# Altium footprint library PcbLib1.PcbLib: 136 footprints (part 3 of 9)
Each footprint in its own frame and in the unit in brackets; x right, y up, seen from the top. Pads: shape width x height; smd on the part's side, far side on the other; paste and mask are expansions set on the pad; w line width, h text height; cw(c..) or ccw(c..) is an arc to the next point about the centre after c.
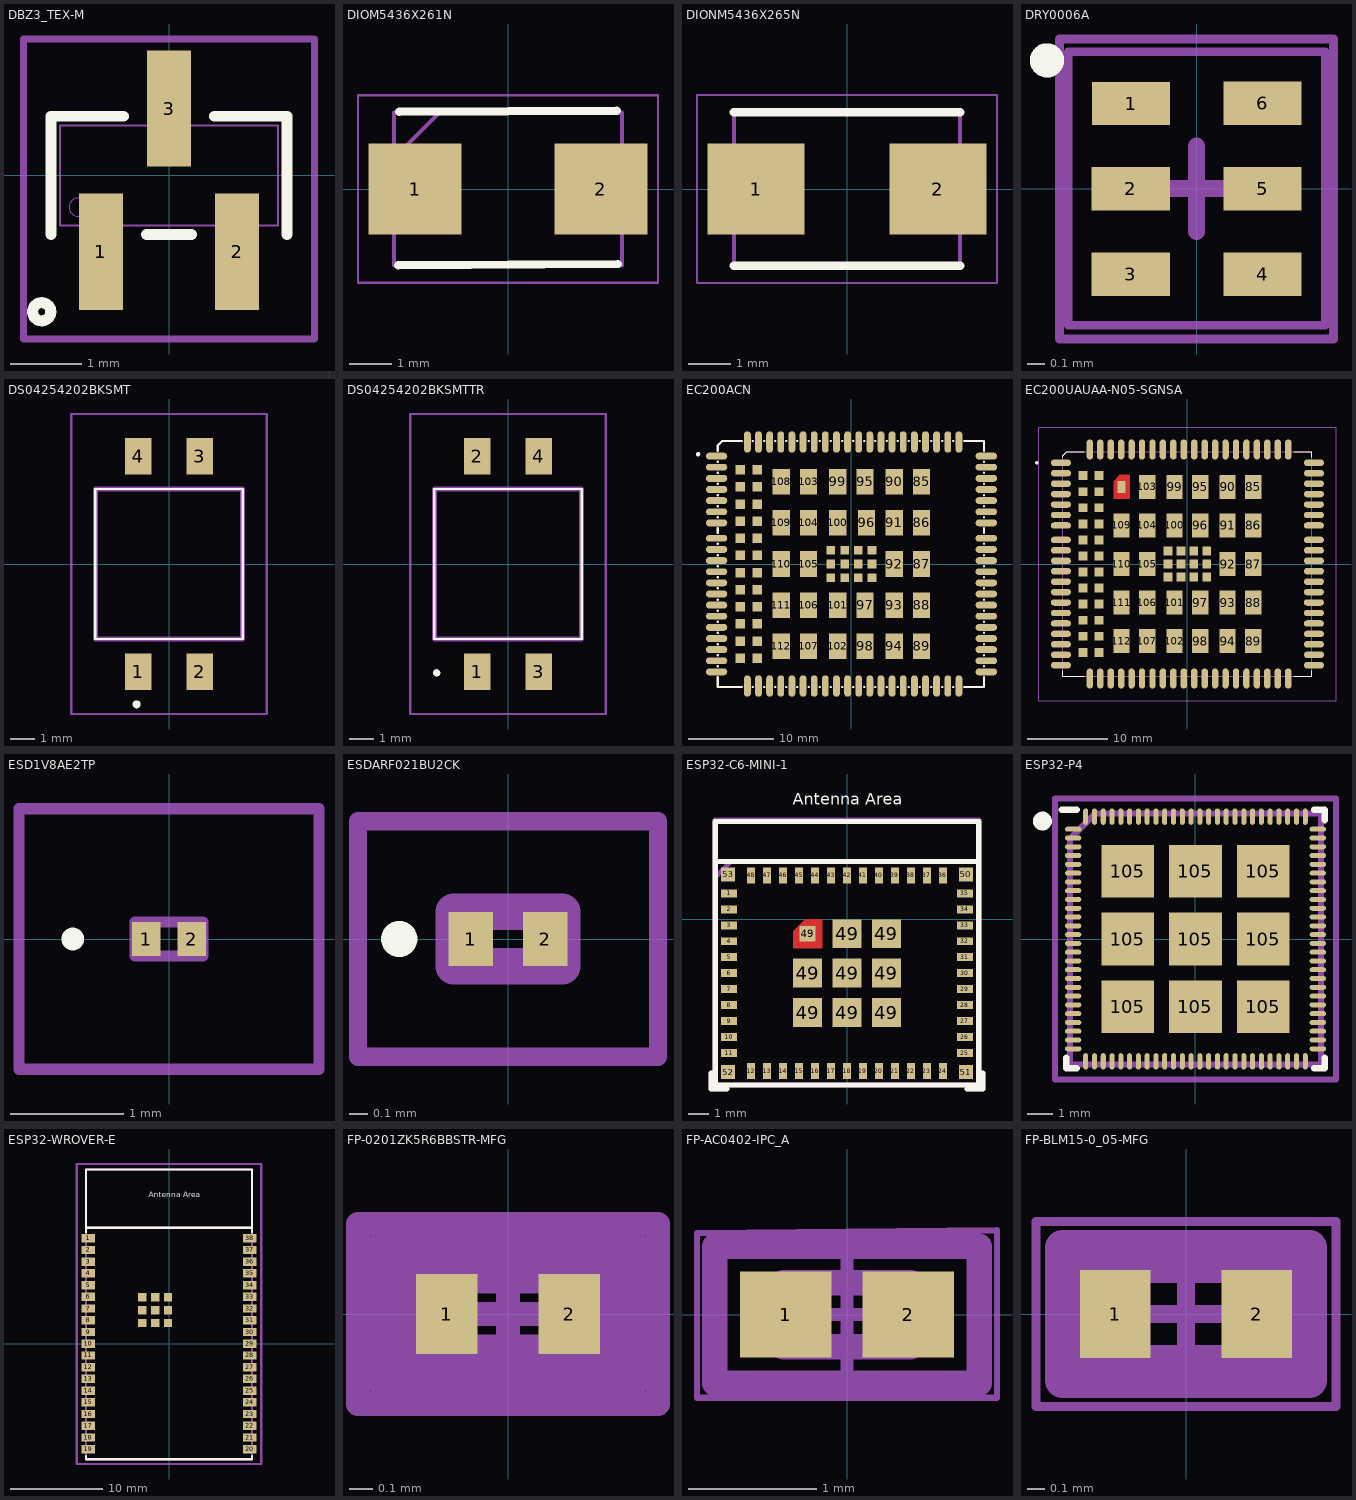
[diagram p2: the footprints below, top view; thin cyan lines are the x and y axes]

## DBZ3_TEX-M [mil]
pads (3):
  rect 24x64 smd paste+5.25 mask+5: 1(-37.4,-42) 2(37.4,-42) 3(0,36.75)
Top Overlay:
  circle w6: c-70,-75 r5
  lines w6: -65,-32.5 -65,32.5 -25.1,32.5 ; -12.3,-32.5 12.3,-32.5 ; 25.1,32.5 65,32.5 65,-32.5
Mechanical 13:
  circle w0: c-50,-17.5 r5
  lines w1: -60,-27.5 -60,27.5 60,27.5 60,-27.5 -60,-27.5 ; -47.4,-52 -27.4,-52 -27.4,-27.5 -47.4,-27.5 -47.4,-52 ; -10,27.5 -10,52 10,52 10,27.5 -10,27.5 ; 27.4,-52 47.4,-52 47.4,-27.5 27.4,-27.5 27.4,-52
Mechanical 15:
  lines w3.99: -80,-90 80,-90 80,75 -80,75 -80,-90
3D body "DBZ3_TEX.step": height 44.09, standoff 0, extent -60,-52.01 60,52.01

## DIOM5436X261N [mm]
pads (2):
  rect 2.2x2.15 smd: 1(-2.2,0) 2(2.2,0)
Top Overlay:
  lines w0.2: -2.6,-1.8 2.6,-1.775 ; -2.575,1.825 2.575,1.85
Top Courtyard:
  lines w0.05: -3.55,-2.22 3.55,-2.22 3.55,2.22 -3.55,2.22 -3.55,-2.22
Top 3D Body:
  lines w0.1: -2.7,0.735 -1.625,1.81 ; -2.7,-1.81 2.7,-1.81 2.7,1.81 -2.7,1.81 -2.7,-1.81
3D body "SMBJ14CA.stp": height 2.61, standoff 0, extent -2.7,-1.81 2.7,1.81

## DIONM5436X265N [mm]
pads (2):
  rect 2.3x2.15 smd: 1(-2.15,0) 2(2.15,0)
Top Overlay:
  lines w0.2: -2.675,-1.812 2.675,-1.812 ; -2.675,1.812 2.675,1.812
Mechanical 13:
  lines w0.1: -2.675,-1.812 2.675,-1.812 2.675,1.812 -2.675,1.812 -2.675,-1.812
Mechanical 15:
  lines w0.05: -3.55,-2.225 3.55,-2.225 3.55,2.225 -3.55,2.225 -3.55,-2.225
3D body "SMBJ14CA_R4G.stp": height 2.65, standoff 0, extent -2.675,-1.813 2.675,1.813

## DRY0006A [mil]
pads (6):
  rect 18x10 smd: 1(-15.09,19.6) 2(-15.16,0) 3(-15.16,-19.68) 4(15.16,-19.68) 5(15.16,0) 6(15.16,19.68)
Top Overlay:
  circle w3.94: c-34.45,29.53 r1.97
Top Courtyard:
  lines w1.97: -29.53,-31.5 29.61,-31.5 29.61,31.5 -29.53,31.5 -29.53,-31.5
  lines w3.94: -9.84,0 9.84,0 ; 0,-9.84 0,9.84
Mechanical 15:
  lines w1.98: -31.58,-34.61 -31.58,34.45 31.5,34.45 31.5,-34.61 -31.58,-34.61
3D body: height 23.62, standoff 0, extent -19.68,-28.54 19.68,28.54

## DS04254202BKSMT [mm]
pads (4):
  rect 1.1x1.5 smd: 1(-1.27,-4.45) 2(1.27,-4.45) 3(1.27,4.45) 4(-1.27,4.45)
Top Overlay:
  lines w0.1: -3.04,-3.1 -3.04,3.1 3.04,3.1 3.04,-3.1 -3.04,-3.1
  lines w0.2: -1.4,-5.8 ccw(c-1.335,-5.8) -1.27,-5.8 ; -1.4,-5.8 cw(c-1.335,-5.8) -1.27,-5.8 ; -1.4,-5.8 ccw(c-1.335,-5.8) -1.27,-5.8
Top Courtyard:
  lines w0.1: -4.04,-6.2 -4.04,6.2 4.04,6.2 4.04,-6.2 -4.04,-6.2
Top 3D Body:
  lines w0.2: -3.04,-3.1 -3.04,3.1 3.04,3.1 3.04,-3.1 -3.04,-3.1
3D body "DS04-254-2-02BK-SMT.stp": height 4, standoff 0, extent -3.043,-4.953 3.037,4.947

## DS04254202BKSMTTR [mm]
pads (4):
  rect 1.1x1.5 smd: 1(-1.27,-4.45) 2(-1.27,4.45) 3(1.27,-4.45) 4(1.27,4.45)
Top Overlay:
  lines w0.1: -3.04,-3.1 -3.04,3.1 3.04,3.1 3.04,-3.1 -3.04,-3.1
  lines w0.2: -3,-4.5 ccw(c-2.95,-4.5) -2.9,-4.5 ; -3,-4.5 cw(c-2.95,-4.5) -2.9,-4.5 ; -3,-4.5 ccw(c-2.95,-4.5) -2.9,-4.5
Top Courtyard:
  lines w0.1: -4.04,-6.2 -4.04,6.2 4.04,6.2 4.04,-6.2 -4.04,-6.2
Top 3D Body:
  lines w0.2: -3.04,-3.1 -3.04,3.1 3.04,3.1 3.04,-3.1 -3.04,-3.1
3D body "DS04-254-2-02BK-SMT-TR.stp": height 4, standoff 0, extent -3.043,-4.953 3.037,4.947

## EC200ACN [mm]
pads (144):
  oval 2.5x0.8 smd paste+0 mask+0: 1(-15.75,12.6) 2(-15.75,11.3) 3(-15.75,10) 4(-15.75,8.7) 5(-15.75,7.4) 6(-15.75,6.1) 7(-15.75,4.8) 8(-15.75,0.4) 9(-15.75,-0.9) 10(-15.75,-2.2) 11(-15.75,-3.5) 12(-15.75,-4.8) 13(-15.75,-6.1) 14(-15.75,-7.4) 15(-15.75,-8.7) 16(-15.75,-10) 17(-15.75,-11.3) 18(-15.75,-12.6) 37(15.75,-12.6) 38(15.75,-11.3) 39(15.75,-10) 40(15.75,-8.7) 41(15.75,-7.4) 42(15.75,-6.1) 43(15.75,-4.8) 44(15.75,-3.5) 45(15.75,-2.2) 46(15.75,-0.9) 47(15.75,0.4) 48(15.75,4.8) 49(15.75,6.1) 50(15.75,7.4) 51(15.75,8.7) 52(15.75,10) 53(15.75,11.3) 54(15.75,12.6) 141(-15.75,3) 142(-15.75,1.7) 143(15.75,1.7) 144(15.75,3)
  oval 0.8x2.5 smd paste+0 mask+0: 19(-9.55,-14.25) 20(-8.25,-14.25) 21(-6.95,-14.25) 22(-5.65,-14.25) 23(-4.35,-14.25) 24(-3.05,-14.25) 25(-1.75,-14.25) 26(-0.45,-14.25) 27(0.85,-14.25) 28(2.15,-14.25) 29(3.45,-14.25) 30(4.75,-14.25) 31(6.05,-14.25) 32(7.35,-14.25) 33(8.65,-14.25) 34(9.95,-14.25) 35(11.25,-14.25) 36(12.55,-14.25) 55(12.55,14.25) 56(11.25,14.25) 57(9.95,14.25) 58(8.65,14.25) 59(7.35,14.25) 60(6.05,14.25) 61(4.75,14.25) 62(3.45,14.25) 63(2.15,14.25) 64(0.85,14.25) 65(-0.45,14.25) 66(-1.75,14.25) 67(-3.05,14.25) 68(-4.35,14.25) 69(-5.65,14.25) 70(-6.95,14.25) 71(-8.25,14.25) 72(-9.55,14.25) 113(-10.85,14.25) 114(-12.15,14.25) 115(-10.85,-14.25) 116(-12.15,-14.25)
  rect 1x1 smd paste+0 mask+0: 73(2.4,1.6) 74(2.4,0) 75(2.4,-1.6) 76(0.8,1.6) 77(0.8,0) 78(0.8,-1.6) 79(-0.8,1.6) 80(-0.8,0) 81(-0.8,-1.6) 82(-2.4,1.6) 83(-2.4,0) 84(-2.4,-1.6)
  rect 2x3 smd paste+0 mask+0: 85(8.2,9.6) 86(8.2,4.8) 87(8.2,0) 88(8.2,-4.8) 89(8.2,-9.6) 90(5,9.6) 91(5,4.8) 92(5,0) 93(5,-4.8) 94(5,-9.6) 95(1.6,9.6) 96(1.778,4.8) 97(1.6,-4.8) 98(1.6,-9.6) 99(-1.6,9.6) 100(-1.6,4.8) 101(-1.6,-4.8) 102(-1.6,-9.6) 103(-5,9.6) 104(-5,4.8) 105(-5,0) 106(-5,-4.8) 107(-5,-9.6) 108(-8.2,9.6) 109(-8.2,4.8) 110(-8.2,0) 111(-8.2,-4.8) 112(-8.2,-9.6)
  rect 1.1x1.1 smd paste+0 mask+0: 117(-11,11) 118(-11,9) 119(-11,7) 120(-11,5) 121(-11,3) 122(-11,1) 123(-11,-1) 124(-11,-3) 125(-11,-5) 126(-11,-7) 127(-11,-9) 128(-11,-11) 129(-13,11) 130(-13,9) 131(-13,7) 132(-13,5) 133(-13,3) 134(-13,1) 135(-13,-1) 136(-13,-3) 137(-13,-5) 138(-13,-7) 139(-13,-9) 140(-13,-11)
Top Overlay:
  circle w0.254: c-17.907,12.827 r0.127
  lines w0.254: -15.621,-13.231 -15.621,-14.351 -12.781,-14.351 ; -15.621,-11.969 -15.621,-11.931 ; -15.621,-10.669 -15.621,-10.631 ; -15.621,-9.369 -15.621,-9.331 ; -15.621,-8.069 -15.621,-8.031 ; -15.621,-6.769 -15.621,-6.731 ; -15.621,-5.469 -15.621,-5.431 ; -15.621,-4.169 -15.621,-4.131 ; -15.621,-2.869 -15.621,-2.831 ; -15.621,-1.569 -15.621,-1.531 ; -15.621,-0.269 -15.621,-0.231 ; -15.621,1.031 -15.621,1.069 ; -15.621,2.331 -15.621,2.369 ; -15.621,3.631 -15.621,4.169 ; -15.621,5.431 -15.621,5.469 ; -15.621,6.731 -15.621,6.769 ; -15.621,8.031 -15.621,8.069 ; -15.621,9.331 -15.621,9.369 ; -15.621,10.631 -15.621,10.669 ; -15.621,11.931 -15.621,11.969 ; -15.621,13.231 -15.621,13.843 -15.113,14.351 -14.224,14.351 -12.781,14.351 ; -11.519,-14.351 -11.481,-14.351 ; -11.519,14.351 -11.481,14.351 ; -10.219,-14.351 -10.181,-14.351 ; -10.219,14.351 -10.181,14.351 ; -8.919,-14.351 -8.881,-14.351 ; -8.919,14.351 -8.881,14.351 ; -7.619,-14.351 -7.581,-14.351 ; -7.619,14.351 -7.581,14.351 ; -6.319,-14.351 -6.281,-14.351 ; -6.319,14.351 -6.281,14.351 ; -5.019,-14.351 -4.981,-14.351 ; -5.019,14.351 -4.981,14.351 ; -3.719,-14.351 -3.681,-14.351 ; -3.719,14.351 -3.681,14.351 ; -2.419,-14.351 -2.381,-14.351 ; -2.419,14.351 -2.381,14.351 ; -1.119,-14.351 -1.081,-14.351 ; -1.119,14.351 -1.081,14.351 ; 0.181,-14.351 0.219,-14.351 ; 0.181,14.351 0.219,14.351 ; 1.481,-14.351 1.519,-14.351 ; 1.481,14.351 1.519,14.351 ; 2.781,-14.351 2.819,-14.351 ; 2.781,14.351 2.819,14.351 ; 4.081,-14.351 4.119,-14.351 ; 4.081,14.351 4.119,14.351 ; 5.381,-14.351 5.419,-14.351 ; 5.381,14.351 5.419,14.351 ; 6.681,-14.351 6.719,-14.351 ; 6.681,14.351 6.719,14.351 ; 7.981,-14.351 8.019,-14.351 ; 7.981,14.351 8.019,14.351 ; 9.281,-14.351 9.319,-14.351 ; 9.281,14.351 9.319,14.351 ; 10.581,-14.351 10.619,-14.351 ; 10.581,14.351 10.619,14.351 ; 11.881,-14.351 11.919,-14.351 ; 11.881,14.351 11.919,14.351 ; 13.181,-14.351 15.494,-14.351 15.494,-13.231 ; 13.181,14.351 15.494,14.351 15.494,13.231 ; 15.494,-11.969 15.494,-11.931 ; 15.494,-10.669 15.494,-10.631 ; 15.494,-9.369 15.494,-9.331 ; 15.494,-8.069 15.494,-8.031 ; 15.494,-6.769 15.494,-6.731 ; 15.494,-5.469 15.494,-5.431 ; 15.494,-4.169 15.494,-4.131 ; 15.494,-2.869 15.494,-2.831 ; 15.494,-1.569 15.494,-1.531 ; 15.494,-0.269 15.494,-0.231 ; 15.494,1.031 15.494,1.069 ; 15.494,2.331 15.494,2.369 ; 15.494,3.631 15.494,4.169 ; 15.494,5.431 15.494,5.469 ; 15.494,6.731 15.494,6.769 ; 15.494,8.031 15.494,8.069 ; 15.494,9.331 15.494,9.369 ; 15.494,10.631 15.494,10.669 ; 15.494,11.931 15.494,11.969
3D body "EC200AEUHA-N06-MN0AA--3DModel-STEP-56544.STEP": height 2.6, standoff 0, extent -16,-14.5 16,14.5

## EC200UAUAA-N05-SGNSA [mm]
height 2.6
pads (144):
  oval 2.5x0.8 smd paste-2: 1(-15.75,12.6) 2(-15.75,11.3) 3(-15.75,10) 4(-15.75,8.7) 5(-15.75,7.4) 6(-15.75,6.1) 7(-15.75,4.8) 8(-15.75,0.4) 9(-15.75,-0.9) 10(-15.75,-2.2) 11(-15.75,-3.5) 12(-15.75,-4.8) 13(-15.75,-6.1) 14(-15.75,-7.4) 15(-15.75,-8.7) 16(-15.75,-10) 17(-15.75,-11.3) 18(-15.75,-12.6) 37(15.75,-12.6) 38(15.75,-11.3) 39(15.75,-10) 40(15.75,-8.7) 41(15.75,-7.4) 42(15.75,-6.1) 43(15.75,-4.8) 44(15.75,-3.5) 45(15.75,-2.2) 46(15.75,-0.9) 47(15.75,0.4) 48(15.75,4.8) 49(15.75,6.1) 50(15.75,7.4) 51(15.75,8.7) 52(15.75,10) 53(15.75,11.3) 54(15.75,12.6) 141(-15.75,3) 142(-15.75,1.7) 143(15.75,1.7) 144(15.75,3)
  oval 0.8x2.5 smd paste-2: 19(-9.55,-14.25) 20(-8.25,-14.25) 21(-6.95,-14.25) 22(-5.65,-14.25) 23(-4.35,-14.25) 24(-3.05,-14.25) 25(-1.75,-14.25) 26(-0.45,-14.25) 27(0.85,-14.25) 28(2.15,-14.25) 29(3.45,-14.25) 30(4.75,-14.25) 31(6.05,-14.25) 32(7.35,-14.25) 33(8.65,-14.25) 34(9.95,-14.25) 35(11.25,-14.25) 36(12.55,-14.25) 55(12.55,14.25) 56(11.25,14.25) 57(9.95,14.25) 58(8.65,14.25) 59(7.35,14.25) 60(6.05,14.25) 61(4.75,14.25) 62(3.45,14.25) 63(2.15,14.25) 64(0.85,14.25) 65(-0.45,14.25) 66(-1.75,14.25) 67(-3.05,14.25) 68(-4.35,14.25) 69(-5.65,14.25) 70(-6.95,14.25) 71(-8.25,14.25) 72(-9.55,14.25) 113(-10.85,14.25) 114(-12.15,14.25) 115(-10.85,-14.25) 116(-12.15,-14.25)
  rect 1.1x1.1 smd paste-2: 73(2.4,1.6) 74(2.4,0) 75(2.4,-1.6) 76(0.8,1.6) 77(0.8,0) 78(0.8,-1.6) 79(-0.8,1.6) 80(-0.8,0) 81(-0.8,-1.6) 82(-2.4,1.6) 83(-2.4,0) 84(-2.4,-1.6) 117(-11,11) 118(-11,9) 119(-11,7) 120(-11,5) 121(-11,3) 122(-11,1) 123(-11,-1) 124(-11,-3) 125(-11,-5) 126(-11,-7) 127(-11,-9) 128(-11,-11) 129(-13,11) 130(-13,9) 131(-13,7) 132(-13,5) 133(-13,3) 134(-13,1) 135(-13,-1) 136(-13,-3) 137(-13,-5) 138(-13,-7) 139(-13,-9) 140(-13,-11)
  rect 2x3 smd paste-3: 85(8.2,9.6) 86(8.2,4.8) 87(8.2,0) 88(8.2,-4.8) 89(8.2,-9.6) 90(5,9.6) 91(5,4.8) 92(5,0) 93(5,-4.8) 94(5,-9.6) 95(1.6,9.6) 96(1.6,4.8) 97(1.6,-4.8) 98(1.6,-9.6) 99(-1.6,9.6) 100(-1.6,4.8) 101(-1.6,-4.8) 102(-1.6,-9.6) 103(-5,9.6) 104(-5,4.8) 105(-5,0) 106(-5,-4.8) 107(-5,-9.6) 109(-8.2,4.8) 110(-8.2,0) 111(-8.2,-4.8) 112(-8.2,-9.6)
  rect 1x1.5 smd paste-2 mask+0: 108(-8.2,9.6)
Top Layer:
  region: -7.2,8.1 -9.2,8.1 -9.2,10.3 -8.4,11.1 -7.2,11.1
Top Overlay:
  circle w0.2: c-18.75,12.6 r0.1
  lines w0.127: -15.5,-13.32 -15.5,-14 -12.87,-14 ; -15.5,13.32 -15.5,13.5 -15,14 -12.87,14 ; 13.27,-14 15.5,-14 15.5,-13.32 ; 13.27,14 15.5,14 15.5,13.32
Top Paste:
  drawing of 216 lines, arcs and shapes, not listed
Top Solder:
  region: -7.1,8 -9.3,8 -9.3,10.341 -8.441,11.2 -7.1,11.2
Mechanical 13:
  circle w0.2: c-18.75,12.6 r0.1
  lines w0.127: -15.5,-14 -15.5,13.5 -15,14 15.5,14 15.5,-14 -15.5,-14
Mechanical 15:
  lines w0.05: -18.5,-17 18.5,-17 18.5,17 -18.5,17 -18.5,-17
3D body "step_temp.STEP": height 1.55, standoff -0.8, extent -15.5,-14 15.5,14

## ESD1V8AE2TP [mm]
pads (2):
  rect 0.25x0.3 smd: 1(-0.2,0) 2(0.2,0)
Top Overlay:
  lines w0.1: -0.9,0 ccw(c-0.85,0) -0.8,0 ccw(c-0.85,0) -0.9,0
Mechanical 13:
  lines w0.1: -0.3,-0.15 0.3,-0.15 0.3,0.15 -0.3,0.15 -0.3,-0.15
Mechanical 15:
  lines w0.1: -1.325,-1.15 1.325,-1.15 1.325,1.15 -1.325,1.15 -1.325,-1.15
3D body "ESD1V8AE2-TP.stp": height 0.31, standoff 0, extent -0.303,-0.15 0.297,0.15

## ESDARF021BU2CK [mm]
pads (2):
  rect 0.244x0.3 smd: 1(-0.206,0) 2(0.206,0)
Top Overlay:
  lines w0.1: -0.6,-0.05 cw(c-0.6,0) -0.6,0.05 cw(c-0.6,0) -0.6,-0.05
Mechanical 13:
  lines w0.2: -0.3,-0.15 0.3,-0.15 0.3,0.15 -0.3,0.15 -0.3,-0.15
Mechanical 15:
  lines w0.1: -0.828,-0.65 0.828,-0.65 0.828,0.65 -0.828,0.65 -0.828,-0.65
3D body "ESDARF02-1BU2CK.stp": height 0.43, standoff 0, extent -0.304,-0.15 0.304,0.15

## ESP32-C6-MINI-1 [mm]
pads (61):
  rect 0.8x0.4 smd: 1(-5.9,1.3) 2(-5.9,0.5) 3(-5.9,-0.3) 4(-5.9,-1.1) 5(-5.9,-1.9) 6(-5.9,-2.7) 7(-5.9,-3.5) 8(-5.9,-4.3) 9(-5.9,-5.1) 10(-5.9,-5.9) 11(-5.9,-6.7) 25(5.9,-6.7) 26(5.9,-5.9) 27(5.9,-5.1) 28(5.9,-4.3) 29(5.9,-3.5) 30(5.9,-2.7) 31(5.9,-1.9) 32(5.9,-1.1) 33(5.9,-0.3) 34(5.9,0.5) 35(5.9,1.3)
  rect 0.4x0.8 smd: 12(-4.8,-7.6) 13(-4,-7.6) 14(-3.2,-7.6) 15(-2.4,-7.6) 16(-1.6,-7.6) 17(-0.8,-7.6) 18(0,-7.6) 19(0.8,-7.6) 20(1.6,-7.6) 21(2.4,-7.6) 22(3.2,-7.6) 23(4,-7.6) 24(4.8,-7.6) 36(4.8,2.2) 37(4,2.2) 38(3.2,2.2) 39(2.4,2.2) 40(1.6,2.2) 41(0.8,2.2) 42(0,2.2) 43(-0.8,2.2) 44(-1.6,2.2) 45(-2.4,2.2) 46(-3.2,2.2) 47(-4,2.2) 48(-4.8,2.2)
  rect 1.45x1.45 smd: 49(-1.975,-4.675) 49(-1.975,-2.7) 49(0,-4.675) 49(0,-2.7) 49(0,-0.725) 49(1.975,-4.675) 49(1.975,-2.7) 49(1.975,-0.725)
  rect 0.8x0.8 smd: 49(-1.975,-0.725)
  rect 0.7x0.7 smd: 50(5.95,2.25) 51(5.95,-7.65) 52(-5.95,-7.65) 53(-5.95,2.25)
Top Layer:
  region: -1.25,-1.45 -2.7,-1.45 -2.7,-0.6 -2.1,0 -1.25,0
Top Overlay:
  lines w0.254: -6.8,-7.7 -6.8,-8.5 -6,-8.5 ; -6.6,2.9 6.6,2.9 ; 6,-8.5 6.8,-8.5 6.8,-7.7 ; -6.6,-8.3 -6.6,4.9 6.6,4.9 6.6,-8.3 -6.6,-8.3
  text "Antenna Area" at -2.716,5.525 h1
Top Paste:
  region: -1.25,-1.45 -2.7,-1.45 -2.7,-0.6 -2.1,0 -1.25,0
Top Solder:
  region: -1.25,-1.45 -2.7,-1.45 -2.7,-0.6 -2.1,0 -1.25,0
Top 3D Body:
  lines w0.254: -6.8,-7.7 -6.8,-8.5 -6,-8.5 ; -6.6,2.9 6.6,2.9 ; 6,-8.5 6.8,-8.5 6.8,-7.7 ; -6.6,-8.3 -6.6,4.9 6.6,4.9 6.6,-8.3 -6.6,-8.3
  text "Antenna Area" at -2.716,5.525 h1
Mechanical 6:
  lines w0.254: -6.6,2.1 -5.8,2.9 ; -6.6,2.9 6.6,2.9 ; -6.6,-8.3 -6.6,4.975 6.6,4.975 6.6,-8.3 -6.6,-8.3
  text "'.Designator'" at -2.417,-3.114 h1
3D body "ESP32-C6-MINI-1-N4.STEP": height 2.55, standoff 0, extent -6.6,-8.218 6.6,8.382

## ESP32-P4 [mm]
pads (113):
  rrect100% 0.65x0.2 smd: 1(-4.875,4.375) 2(-4.875,4.025) 3(-4.875,3.675) 4(-4.875,3.325) 5(-4.875,2.975) 6(-4.875,2.625) 7(-4.875,2.275) 8(-4.875,1.925) 9(-4.875,1.575) 10(-4.875,1.225) 11(-4.875,0.875) 12(-4.875,0.525) 13(-4.875,0.175) 14(-4.875,-0.175) 15(-4.875,-0.525) 16(-4.875,-0.875) 17(-4.875,-1.225) 18(-4.875,-1.575) 19(-4.875,-1.925) 20(-4.875,-2.275) 21(-4.875,-2.625) 22(-4.875,-2.975) 23(-4.875,-3.325) 24(-4.875,-3.675) 25(-4.875,-4.025) 26(-4.875,-4.375) 53(4.875,-4.375) 54(4.875,-4.025) 55(4.875,-3.675) 56(4.875,-3.325) 57(4.875,-2.975) 58(4.875,-2.625) 59(4.875,-2.275) 60(4.875,-1.925) 61(4.875,-1.575) 62(4.875,-1.225) 63(4.875,-0.875) 64(4.875,-0.525) 65(4.875,-0.175) 66(4.875,0.175) 67(4.875,0.525) 68(4.875,0.875) 69(4.875,1.225) 70(4.875,1.575) 71(4.875,1.925) 72(4.875,2.275) 73(4.875,2.625) 74(4.875,2.975) 75(4.875,3.325) 76(4.875,3.675) 77(4.875,4.025) 78(4.875,4.375)
  rrect100% 0.2x0.65 smd: 27(-4.375,-4.875) 28(-4.025,-4.875) 29(-3.675,-4.875) 30(-3.325,-4.875) 31(-2.975,-4.875) 32(-2.625,-4.875) 33(-2.275,-4.875) 34(-1.925,-4.875) 35(-1.575,-4.875) 36(-1.225,-4.875) 37(-0.875,-4.875) 38(-0.525,-4.875) 39(-0.175,-4.875) 40(0.175,-4.875) 41(0.525,-4.875) 42(0.875,-4.875) 43(1.225,-4.875) 44(1.575,-4.875) 45(1.925,-4.875) 46(2.275,-4.875) 47(2.625,-4.875) 48(2.975,-4.875) 49(3.325,-4.875) 50(3.675,-4.875) 51(4.025,-4.875) 52(4.375,-4.875) 79(4.375,4.875) 80(4.025,4.875) 81(3.675,4.875) 82(3.325,4.875) 83(2.975,4.875) 84(2.625,4.875) 85(2.275,4.875) 86(1.925,4.875) 87(1.575,4.875) 88(1.225,4.875) 89(0.875,4.875) 90(0.525,4.875) 91(0.175,4.875) 92(-0.175,4.875) 93(-0.525,4.875) 94(-0.875,4.875) 95(-1.225,4.875) 96(-1.575,4.875) 97(-1.925,4.875) 98(-2.275,4.875) 99(-2.625,4.875) 100(-2.975,4.875) 101(-3.325,4.875) 102(-3.675,4.875) 103(-4.025,4.875) 104(-4.375,4.875)
  rect 2.1x2.1 smd: 105(-2.7,-2.7) 105(-2.7,0) 105(-2.7,2.7) 105(0,-2.7) 105(0,0) 105(0,2.7) 105(2.7,-2.7) 105(2.7,0) 105(2.7,2.7)
Top Overlay:
  circle w0.254: c-6.1,4.7 r0.25
  region: -6.002,4.935 -5.92,4.88 -5.865,4.798 -5.845,4.7 -5.865,4.602 -5.92,4.52 -6.002,4.465 -6.1,4.445 -6.198,4.465 -6.28,4.52 -6.335,4.602 -6.355,4.7 -6.335,4.798 -6.28,4.88 -6.198,4.935 -6.1,4.955
  lines w0.254: -5.325,5.15 -4.725,5.15 ; -5.15,-4.725 -5.15,-5.15 -4.725,-5.15 ; 4.725,-5.15 5.15,-5.15 5.15,-4.725 ; 4.725,5.15 5.15,5.15 5.15,4.725
Mechanical 4:
  lines w0.254: -5.6,-5.6 5.6,-5.6 5.6,5.6 -5.6,5.6 -5.6,-5.6
Mechanical 6:
  lines w0.254: -5,-5 5,-5 5,5 -4,5 -5,4 -5,-5
  text "'.Designator'" at -1.437,-0.398 h1

## ESP32-WROVER-E [mm]
pads (47):
  rect 1.5x0.9 smd: 1(-8.75,11.43) 2(-8.75,10.16) 3(-8.75,8.89) 4(-8.75,7.62) 5(-8.75,6.35) 6(-8.75,5.08) 7(-8.75,3.81) 8(-8.75,2.54) 9(-8.75,1.27) 10(-8.75,0) 11(-8.75,-1.27) 12(-8.75,-2.54) 13(-8.75,-3.81) 14(-8.75,-5.08) 15(-8.75,-6.35) 16(-8.75,-7.62) 17(-8.75,-8.89) 18(-8.75,-10.16) 19(-8.75,-11.43) 20(8.75,-11.43) 21(8.75,-10.16) 22(8.75,-8.89) 23(8.75,-7.62) 24(8.75,-6.35) 25(8.75,-5.08) 26(8.75,-3.81) 27(8.75,-2.54) 28(8.75,-1.27) 29(8.75,0) 30(8.75,1.27) 31(8.75,2.54) 32(8.75,3.81) 33(8.75,5.08) 34(8.75,6.35) 35(8.75,7.62) 36(8.75,8.89) 37(8.75,10.16) 38(8.75,11.43)
  rect 0.9x0.9 smd: 39(-2.905,5.035) 39(-2.9,2.235) 39(-2.9,3.635) 39(-1.5,2.235) 39(-1.5,3.635) 39(-1.5,5.035) 39(-0.1,2.235) 39(-0.1,3.635) 39(-0.1,5.035)
Top Overlay:
  lines w0.254: -9,-12.175 -9,-12.53 9,-12.53 9,-12.175 ; -9,12.075 -9,18.87 9,18.87 ; -9,12.56 9,12.56 ; 9,12.075 9,18.825
  text "Antenna Area" at -2.216,15.645 h1
Mechanical 4:
  lines w0.254: -10,-13.03 -10,19.47 10,19.47 10,-13.03 -10,-13.03
Mechanical 6:
  text "'.Designator'" at -2.417,2.761 h1
Mechanical 9:
  lines w0.254: -9,12.56 9,12.56 ; -9,-12.53 -9,18.87 9,18.87 9,-12.53 -9,-12.53
3D body "ESP32-WROVER-E.STEP": height 3.3, standoff 0, extent -8.994,-12.48 9.006,18.92

## FP-0201ZK5R6BBSTR-MFG [mm]
pads (2):
  rect 0.26x0.34 smd paste+0 mask+0: 1(-0.26,0) 2(0.26,0)
Top Courtyard:
  lines w0.2: -0.49,-0.288 0.49,-0.288 0.49,0.288 -0.49,0.288 -0.49,-0.288
Top 3D Body:
  lines w0.2: -0.325,-0.188 0.325,-0.188 0.325,0.188 -0.325,0.188 -0.325,-0.188
Top Assembly:
  lines w0.2: -0.49,-0.288 0.49,-0.288 0.49,0.288 -0.49,0.288 -0.49,-0.288
  text ".Designator" at 0,0.024 h0.13
Mechanical 15:
  lines w0.101: -0.635,-0.381 -0.635,0.381 0.635,0.381 0.635,-0.381 -0.635,-0.381
Top Component Center:
  lines w0.1: -0.5,0 0.5,0 ; 0,-0.254 0,0.254
3D body "Cap_AVX_Corporation_0201ZK5R6BBSTR_eec.STEP": height 0.28, standoff 0, extent -0.3,-0.162 0.3,0.162

## FP-AC0402-IPC_A [mm]
pads (2):
  rect 0.715x0.672 smd paste+0 mask+0: 1(-0.479,0) 2(0.479,0)
Top Courtyard:
  lines w0.2: -1.036,-0.536 1.036,-0.536 1.036,0.536 -1.036,0.536 -1.036,-0.536
Top 3D Body:
  lines w0.2: -0.5,-0.25 0.5,-0.25 0.5,0.25 -0.5,0.25 -0.5,-0.25
Top Assembly:
  lines w0.2: -1.036,-0.536 1.036,-0.536 1.036,0.536 -1.036,0.536 -1.036,-0.536
  text ".Designator" at -0.575,0.273 h0.25
Mechanical 15:
  lines w0.05: -1.175,-0.65 1.175,-0.65 1.175,0.66 -1.175,0.637 -1.175,-0.65
Top Component Center:
  lines w0.1: -0.5,0 0.5,0 ; 0,-0.5 0,0.5
3D body "Res_Yageo_AC0402FR-0716R2L_eec.STEP": height 0.25, standoff 0, extent -1.036,-0.536 1.036,0.536

## FP-BLM15-0_05-MFG [mm]
pads (2):
  rect 0.4x0.5 smd paste+0 mask+0: 1(-0.4,0) 2(0.4,0)
Top Courtyard:
  lines w0.2: -0.7,-0.375 -0.7,0.375 0.7,0.375 0.7,-0.375 -0.7,-0.375
Top 3D Body:
  lines w0.2: -0.525,-0.275 -0.525,0.275 0.525,0.275 0.525,-0.275 -0.525,-0.275
Top Assembly:
  lines w0.2: -0.7,-0.375 -0.7,0.375 0.7,0.375 0.7,-0.375 -0.7,-0.375
  text ".Designator" at -0.6,0.073 h0.25
Mechanical 15:
  lines w0.05: -0.85,-0.525 -0.85,0.525 0.85,0.525 0.85,-0.525 -0.85,-0.525
Top Component Center:
  lines w0.1: -0.5,0 0.5,0 ; 0,-0.4 0,0.4
3D body "FBead_Murata_BLM15PX471SN1B_eec.STEP": height 0.25, standoff 0, extent -0.7,-0.375 0.7,0.375